# Altium footprint library pre_CONNECTOR.PcbLib: 64 footprints (part 3 of 4)
Each footprint in its own frame and in the unit in brackets; x right, y up, seen from the top. Pads: shape width x height; smd on the part's side, far side on the other; paste and mask are expansions set on the pad; w line width, h text height; cw(c..) or ccw(c..) is an arc to the next point about the centre after c.
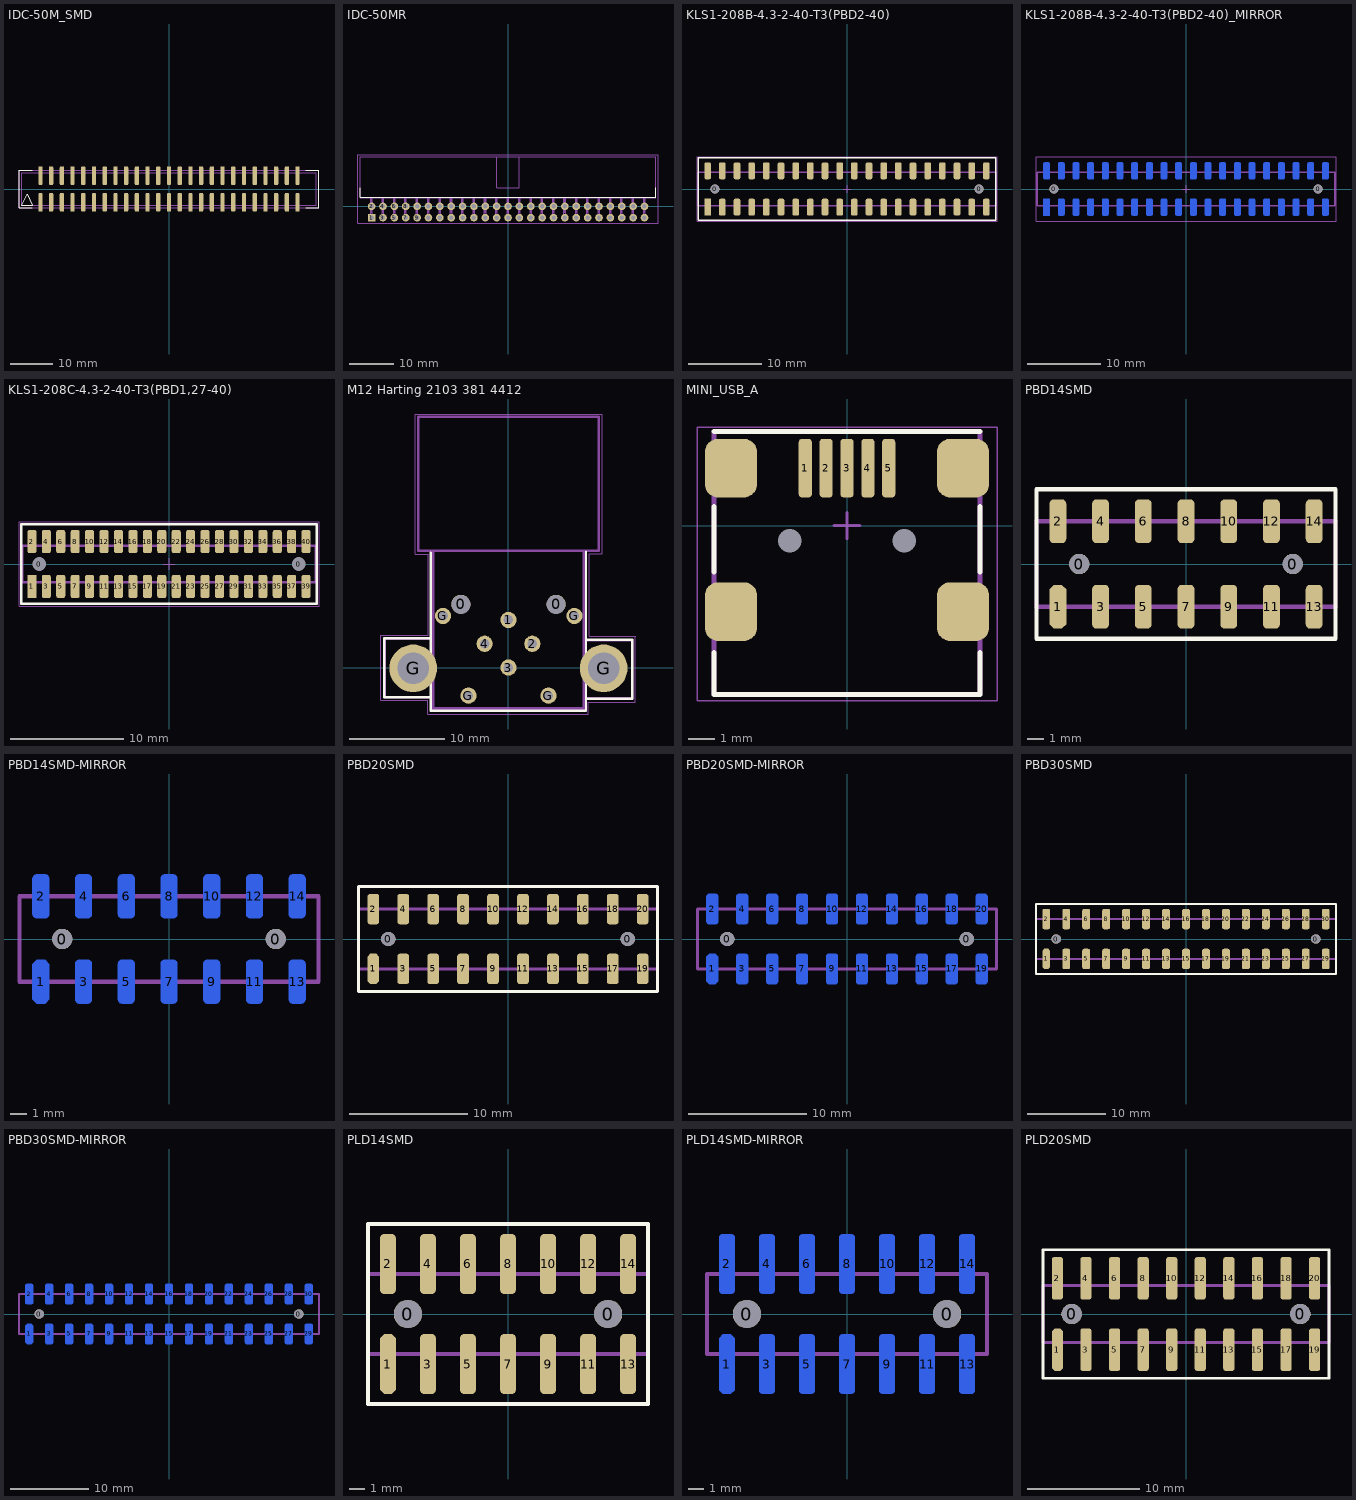
[diagram p2: the footprints below, top view; thin cyan lines are the x and y axes]

## IDC-50M_SMD [mm]
pads (50):
  rrect50% 1x4.4 smd: 1(-30.48,-3.175) 2(-30.48,3.175) 3(-27.94,-3.175) 4(-27.94,3.175) 5(-25.4,-3.175) 6(-25.4,3.175) 7(-22.86,-3.175) 8(-22.86,3.175) 9(-20.32,-3.175) 10(-20.32,3.175) 11(-17.78,-3.175) 12(-17.78,3.175) 13(-15.24,-3.175) 14(-15.24,3.175) 15(-12.7,-3.175) 16(-12.7,3.175) 17(-10.16,-3.175) 18(-10.16,3.175) 19(-7.62,-3.175) 20(-7.62,3.175) 21(-5.08,-3.175) 22(-5.08,3.175) 23(-2.54,-3.175) 24(-2.54,3.175) 25(0,-3.175) 26(0,3.175) 27(2.54,-3.175) 28(2.54,3.175) 29(5.08,-3.175) 30(5.08,3.175) 31(7.62,-3.175) 32(7.62,3.175) 33(10.16,-3.175) 34(10.16,3.175) 35(12.7,-3.175) 36(12.7,3.175) 37(15.24,-3.175) 38(15.24,3.175) 39(17.78,-3.175) 40(17.78,3.175) 41(20.32,-3.175) 42(20.32,3.175) 43(22.86,-3.175) 44(22.86,3.175) 45(25.4,-3.175) 46(25.4,3.175) 47(27.94,-3.175) 48(27.94,3.175) 49(30.48,-3.175) 50(30.48,3.175)
Top Overlay:
  lines w0.254: -32.385,-4.445 -35.56,-4.445 -35.56,4.445 -32.385,4.445 ; 32.385,-4.445 35.56,-4.445 35.56,4.445 32.385,4.445 ; -34.925,-3.81 -32.385,-3.81 -33.655,-1.27 -34.925,-3.81
Top Assy:
  lines w0.254: -2.54,-4.445 -2.54,-3.81 ; 2.54,-4.445 2.54,-3.81 ; -35.56,-4.445 35.56,-4.445 35.56,4.445 -35.56,4.445 -35.56,-4.445 ; -34.925,-3.81 -34.925,3.81 34.925,3.81 34.925,-3.81 -34.925,-3.81
3D body: height 10.2, standoff 1.6, extent -35.56,-4.445 35.56,4.445

## IDC-50MR [mm]
height 8.75
pads (50):
  rect 1.7x1.7 hole 1: 1(-30.48,-2.54)
  round 1.7 hole 1: 2(-30.48,0) 3(-27.94,-2.54) 4(-27.94,0) 5(-25.4,-2.54) 6(-25.4,0) 7(-22.86,-2.54) 8(-22.86,0) 9(-20.32,-2.54) 10(-20.32,0) 11(-17.78,-2.54) 12(-17.78,0) 13(-15.24,-2.54) 14(-15.24,0) 15(-12.7,-2.54) 16(-12.7,0) 17(-10.16,-2.54) 18(-10.16,0) 19(-7.62,-2.54) 20(-7.62,0) 21(-5.08,-2.54) 22(-5.08,0) 23(-2.54,-2.54) 24(-2.54,0) 25(0,-2.54) 26(0,0) 27(2.54,-2.54) 28(2.54,0) 29(5.08,-2.54) 30(5.08,0) 31(7.62,-2.54) 32(7.62,0) 33(10.16,-2.54) 34(10.16,0) 35(12.7,-2.54) 36(12.7,0) 37(15.24,-2.54) 38(15.24,0) 39(17.78,-2.54) 40(17.78,0) 41(20.32,-2.54) 42(20.32,0) 43(22.86,-2.54) 44(22.86,0) 45(25.4,-2.54) 46(25.4,0) 47(27.94,-2.54) 48(27.94,0) 49(30.48,-2.54) 50(30.48,0)
Top Overlay:
  lines w0.254: -33.02,4.1 -33.02,2 -6.35,2 33.02,2 33.02,4.1
Top Assy:
  lines w0.254: -30.485,-1.425 -30.485,2 ; -27.945,-1.425 -27.945,2 ; -25.395,-1.425 -25.395,1.95 ; -22.87,-1.425 -22.87,1.975 ; -20.345,-1.45 -20.345,1.975 ; -17.795,-1.45 -17.795,1.925 ; -15.245,-1.425 -15.245,2 ; -12.695,-1.425 -12.695,1.95 ; -10.17,-1.425 -10.17,1.975 ; -7.645,-1.45 -7.645,1.975 ; -5.095,-1.45 -5.095,1.925 ; -2.57,-1.45 -2.57,1.95 ; 0.005,-1.4 0.005,2.025 ; 2.53,-1.45 2.53,1.975 ; 5.07,-1.425 5.07,1.975 ; 7.595,-1.45 7.595,1.975 ; 10.145,-1.45 10.145,1.925 ; 12.67,-1.45 12.67,1.95 ; 15.245,-1.4 15.245,2.025 ; 17.77,-1.45 17.77,1.975 ; 20.295,-1.45 20.295,1.975 ; 22.845,-1.45 22.845,1.925 ; 25.37,-1.45 25.37,1.95 ; 27.945,-1.4 27.945,2.025 ; 30.47,-1.45 30.47,1.975 ; -33.02,2 -33.02,11.1 -2.5,11.1 -2.5,4.1 2.5,4.1 2.5,11.1 33.02,11.1 33.02,2 -33.02,2
Mechanical 13:
  lines w0.1: -30.66,2.025 -30.66,-2.54 -30.31,-2.54 -30.31,2.025 ; -30.645,2.025 -30.645,-2.54 -30.295,-2.54 -30.295,2.025 ; -28.12,2.025 -28.12,-2.54 -27.77,-2.54 -27.77,2.025 ; -25.57,2.057 -25.57,-2.485 -25.22,-2.475 -25.22,2.057 ; -23.045,-2.508 -23.045,2.057 ; -23.04,-2.54 -22.69,-2.54 ; -22.695,-2.508 -22.695,2.057 ; -20.52,-2.508 -20.52,2.057 ; -20.5,-2.54 -20.15,-2.54 ; -20.17,-2.508 -20.17,2.057 ; -17.96,-2.54 -17.61,-2.54 ; -17.945,2.025 -17.945,-2.54 -17.595,-2.54 ; -17.62,-2.533 -17.62,2.033 ; -15.42,2.025 -15.42,-2.54 -15.07,-2.54 -15.07,2.025 ; -12.87,2.057 -12.87,-2.485 -12.52,-2.475 -12.52,2.057 ; -10.345,-2.508 -10.345,2.057 ; -10.34,-2.54 -9.99,-2.54 ; -9.995,-2.508 -9.995,2.057 ; -7.82,-2.508 -7.82,2.057 ; -7.8,-2.54 -7.45,-2.54 ; -7.47,-2.508 -7.47,2.057 ; -5.27,-2.533 -5.27,2.033 ; -5.26,-2.54 -4.91,-2.54 ; -4.92,-2.533 -4.92,2.033 ; -2.745,-2.533 -2.745,2.033 ; -2.72,-2.54 -2.37,-2.54 ; -2.395,-2.533 -2.395,2.033 ; -0.18,-2.54 0.17,-2.54 ; -0.17,-2.533 -0.17,2.033 ; 0.18,-2.533 0.18,2.033 ; 2.355,2 2.355,-2.565 2.705,-2.565 2.705,2 ; 4.9,-2.54 5.25,-2.54 ; 4.905,2.025 4.905,-2.54 5.255,-2.54 5.255,2.025 ; 7.42,-2.508 7.42,2.057 ; 7.44,-2.54 7.79,-2.54 ; 7.77,-2.508 7.77,2.057 ; 9.97,-2.533 9.97,2.033 ; 9.98,-2.54 10.33,-2.54 ; 10.32,-2.533 10.32,2.033 ; 12.495,-2.533 12.495,2.033 ; 12.52,-2.54 12.87,-2.54 ; 12.845,-2.533 12.845,2.033 ; 15.06,-2.54 15.41,-2.54 ; 15.07,-2.533 15.07,2.033 ; 15.42,-2.533 15.42,2.033 ; 17.595,2 17.595,-2.565 17.945,-2.565 17.945,2 ; 20.12,-2.508 20.12,2.057 ; 20.14,-2.54 20.49,-2.54 ; 20.47,-2.508 20.47,2.057 ; 22.67,-2.533 22.67,2.033 ; 22.68,-2.54 23.03,-2.54 ; 23.02,-2.533 23.02,2.033 ; 25.195,-2.533 25.195,2.033 ; 25.22,-2.54 25.57,-2.54 ; 25.545,-2.533 25.545,2.033 ; 27.76,-2.54 28.11,-2.54 ; 27.77,-2.533 27.77,2.033 ; 28.12,-2.533 28.12,2.033 ; 30.295,2 30.295,-2.565 30.645,-2.565 30.645,2 ; -33.02,1.95 -33.02,11.1 33.02,11.1 33.02,1.95 -33.02,1.95
Mechanical 15:
  lines w0.05: -33.52,-3.775 33.5,-3.775 33.5,11.525 -33.52,11.525 -33.52,-3.775
  lines w0.1: -20.82,0 -19.82,0 ; -20.32,-0.5 -20.32,0.5 ; -8.12,0 -7.12,0 ; -7.62,-0.5 -7.62,0.5 ; 7.12,0 8.12,0 ; 7.62,-0.5 7.62,0.5 ; 19.82,0 20.82,0 ; 20.32,-0.5 20.32,0.5
3D body: height 5.8, standoff 0, extent 7.394,-2.54 7.77,2.075
3D body: height 5.8, standoff 0, extent 9.944,-2.54 10.32,2.075
3D body: height 5.8, standoff 0, extent 12.469,-2.54 12.845,2.075
3D body: height 5.8, standoff 0, extent 15.044,-2.54 15.42,2.075
3D body: height 5.8, standoff 0, extent 17.569,-2.565 17.945,2.05
3D body: height 5.8, standoff 0, extent -30.686,-2.54 -30.31,2.075
3D body: height 5.8, standoff 0, extent -28.146,-2.54 -27.77,2.075
3D body: height 5.8, standoff 0, extent -25.596,-2.54 -25.22,2.075
3D body: height 5.8, standoff 0, extent -23.071,-2.54 -22.695,2.075
3D body: height 5.8, standoff 0, extent -20.546,-2.54 -20.17,2.075
3D body: height 5.8, standoff 0, extent -17.996,-2.54 -17.62,2.075
3D body: height 5.8, standoff 0, extent 4.879,-2.54 5.255,2.075
3D body: height 5.8, standoff 0, extent 2.329,-2.565 2.705,2.05
3D body: height 5.8, standoff 0, extent -0.196,-2.54 0.18,2.075
3D body: height 5.8, standoff 0, extent -2.771,-2.54 -2.395,2.075
3D body: height 5.8, standoff 0, extent -5.296,-2.54 -4.92,2.075
3D body: height 5.8, standoff 0, extent -7.846,-2.54 -7.47,2.075
3D body: height 5.8, standoff 0, extent -10.371,-2.54 -9.995,2.075
3D body: height 5.8, standoff 0, extent -12.896,-2.54 -12.52,2.075
3D body: height 5.8, standoff 0, extent -15.446,-2.54 -15.07,2.075
3D body: height 9, standoff 0, extent -33.022,2.025 33.02,11.125
3D body: height 5.8, standoff 0, extent 30.269,-2.565 30.645,2.05
3D body: height 5.8, standoff 0, extent 27.744,-2.54 28.12,2.075
3D body: height 5.8, standoff 0, extent 25.169,-2.54 25.545,2.075
3D body: height 5.8, standoff 0, extent 22.644,-2.54 23.02,2.075
3D body: height 5.8, standoff 0, extent 20.094,-2.54 20.47,2.075

## KLS1-208B-4.3-2-40-T3(PBD2-40) [mm] "Female Header, Pitch 2.0mm"
height 4.3
pads (42):
  round 1.2 hole 1.2 unplated: 0(-18,0) 0(18,0)
  rect 0.9x2.3 smd: 1(-19,-2.475)
  rrect50% 0.9x2.3 smd: 2(-19,2.475) 3(-17,-2.475) 4(-17,2.475) 5(-15,-2.475) 6(-15,2.475) 7(-13,-2.475) 8(-13,2.475) 9(-11,-2.475) 10(-11,2.475) 11(-9,-2.475) 12(-9,2.475) 13(-7,-2.475) 14(-7,2.475) 15(-5,-2.475) 16(-5,2.475) 17(-3,-2.475) 18(-3,2.475) 19(-1,-2.475) 20(-1,2.475) 21(1,-2.475) 22(1,2.475) 23(3,-2.475) 24(3,2.475) 25(5,-2.475) 26(5,2.475) 27(7,-2.475) 28(7,2.475) 29(9,-2.475) 30(9,2.475) 31(11,-2.475) 32(11,2.475) 33(13,-2.475) 34(13,2.475) 35(15,-2.475) 36(15,2.475) 37(17,-2.475) 38(17,2.475) 39(19,-2.475) 40(19,2.475)
Top Overlay:
  lines w0.2: -20.3,-4.25 20.3,-4.25 20.3,4.25 -20.3,4.25 -20.3,-4.25
Top Assy:
  lines w0.2: -20.3,-2.25 20.3,-2.25 20.3,2.25 -20.3,2.25 -20.3,-2.25
Mechanical 15:
  lines w0.05: -20.45,-4.4 20.45,-4.4 20.45,4.4 -20.45,4.4 -20.45,-4.4
  lines w0.1: -0.5,0 0.5,0 ; 0,-0.5 0,0.5
3D body: height 4.3, standoff 0, extent -20.3,-2.25 20.3,2.25

## KLS1-208B-4.3-2-40-T3(PBD2-40)_MIRROR [mm] "Female Header, Pitch 2.0mm"
height 4.3
pads (42):
  round 1.2 hole 1.2 unplated: 0(-18,0) 0(18,0)
  rect 0.9x2.3 smd far side: 1(-19,-2.475)
  rrect50% 0.9x2.3 smd far side: 2(-19,2.475) 3(-17,-2.475) 4(-17,2.475) 5(-15,-2.475) 6(-15,2.475) 7(-13,-2.475) 8(-13,2.475) 9(-11,-2.475) 10(-11,2.475) 11(-9,-2.475) 12(-9,2.475) 13(-7,-2.475) 14(-7,2.475) 15(-5,-2.475) 16(-5,2.475) 17(-3,-2.475) 18(-3,2.475) 19(-1,-2.475) 20(-1,2.475) 21(1,-2.475) 22(1,2.475) 23(3,-2.475) 24(3,2.475) 25(5,-2.475) 26(5,2.475) 27(7,-2.475) 28(7,2.475) 29(9,-2.475) 30(9,2.475) 31(11,-2.475) 32(11,2.475) 33(13,-2.475) 34(13,2.475) 35(15,-2.475) 36(15,2.475) 37(17,-2.475) 38(17,2.475) 39(19,-2.475) 40(19,2.475)
Bottom Overlay:
  lines w0.2: -20.3,-4.25 20.3,-4.25 20.3,4.25 -20.3,4.25 -20.3,-4.25
Bottom Assy:
  lines w0.2: -20.3,-2.25 20.3,-2.25 20.3,2.25 -20.3,2.25 -20.3,-2.25
Mechanical 15:
  lines w0.05: -20.45,-4.4 20.45,-4.4 20.45,4.4 -20.45,4.4 -20.45,-4.4
  lines w0.1: -0.5,0 0.5,0 ; 0,-0.5 0,0.5
3D body: height 4.3, standoff 0, extent -20.3,-2.25 20.3,2.25

## KLS1-208C-4.3-2-40-T3(PBD1,27-40) [mm] "Female Header, Pitch 1.27mm"
height 4.3
pads (42):
  round 0.8 hole 1.2 unplated: 0(-11.43,0) 0(11.43,0)
  rect 0.8x2.05 smd: 1(-12.065,-1.975)
  rrect50% 0.8x2.05 smd: 2(-12.065,1.975) 3(-10.795,-1.975) 4(-10.795,1.975) 5(-9.525,-1.975) 6(-9.525,1.975) 7(-8.255,-1.975) 8(-8.255,1.975) 9(-6.985,-1.975) 10(-6.985,1.975) 11(-5.715,-1.975) 12(-5.715,1.975) 13(-4.445,-1.975) 14(-4.445,1.975) 15(-3.175,-1.975) 16(-3.175,1.975) 17(-1.905,-1.975) 18(-1.905,1.975) 19(-0.635,-1.975) 20(-0.635,1.975) 21(0.635,-1.975) 22(0.635,1.975) 23(1.905,-1.975) 24(1.905,1.975) 25(3.175,-1.975) 26(3.175,1.975) 27(4.445,-1.975) 28(4.445,1.975) 29(5.715,-1.975) 30(5.715,1.975) 31(6.985,-1.975) 32(6.985,1.975) 33(8.255,-1.975) 34(8.255,1.975) 35(9.525,-1.975) 36(9.525,1.975) 37(10.795,-1.975) 38(10.795,1.975) 39(12.065,-1.975) 40(12.065,1.975)
Top Overlay:
  lines w0.2: -13,-3.5 -13,3.5 13,3.5 13,-3.5 -13,-3.5
Top Assy:
  lines w0.2: -12.9,-1.6 -12.9,1.6 12.9,1.6 12.9,-1.6 -12.9,-1.6
Mechanical 15:
  lines w0.05: -13.2,-3.7 -13.2,3.7 13.2,3.7 13.2,-3.7 -13.2,-3.7
  lines w0.1: -0.5,0 0.5,0 ; 0,-0.5 0,0.5
3D body: height 4.3, standoff 0, extent -12.9,-1.6 12.9,1.6

## M12 Harting 2103 381 4412 [mm]
pads (12):
  round 2 hole 2 unplated: 0(-5,6.642) 0(5,6.642)
  round 1.7 hole 1: 1(0,5) 2(2.5,2.5) 3(0,0) 4(-2.5,2.5) G(-6.875,5.422) G(-4.2,-2.95) G(4.2,-2.95) G(6.925,5.422)
  round 5 / inner round 3.3 / far side round 8 hole 3.3 unplated: G(-10,-0.075) G(10,-0.075)
Top Overlay:
  lines w0.254: -8.235,3.058 -13.05,3.058 -13.05,-3.125 -8.23,-3.125 ; -8.159,12.075 -8.159,-4.535 8.136,-4.535 8.136,12.15 ; 8.213,2.925 13,2.925 13,-3.289 8.244,-3.289
Top Assy:
  lines w0.254: -13,-3.1 -7.9,-3.1 -7.9,3 -13,3 -13,-3.1 ; -9.5,12.25 -9.5,26.32 9.5,26.32 9.5,12.25 -0.44,12.25 -9.5,12.25 ; -7.9,-4.4 7.9,-4.4 7.9,12.25 -7.9,12.25 -7.9,-4.4 ; 7.896,-3.243 13,-3.243 13,2.857 7.896,2.857 7.896,-3.243
Mechanical 13:
  lines w0.254: -13.006,-3.102 -7.902,-3.102 -7.902,3.001 -13.006,3.001 -13.006,-3.102 ; -9.486,12.25 -9.486,26.315 9.492,26.315 9.492,12.25 -9.486,12.25 ; -7.902,-4.281 -7.902,12.25 7.911,12.25 7.911,-4.281 -7.902,-4.281 ; 7.902,-3.241 7.902,2.858 12.998,2.858 12.998,-3.241 7.902,-3.241
Mechanical 15:
  lines w0.05: -13.425,-3.45 -13.425,3.375 -8.45,3.375 -8.425,3.4 -8.425,11.85 -8.45,11.875 -9.775,11.875 -9.775,26.625 9.85,26.625 9.85,11.925 8.5,11.925 8.5,3.275 13.3,3.275 13.325,3.25 13.325,-3.625 13.3,-3.625 8.4,-3.625 8.4,-4.875 -8.5,-4.875 -8.5,-3.45 -13.425,-3.45
3D body: height 13.8, standoff 0, extent -7.924,-4.281 7.91,12.25
3D body: height 5.9, standoff 0, extent 7.885,-3.161 13.003,2.809
3D body: height 5.9, standoff 0, extent -12.85,-2.94 -7.907,2.86
3D body: height 14.9, standoff 0, extent -9.497,12.227 9.504,26.335

## MINI_USB_A [mm]
pads (11):
  rrect50% 0.5x2.25 smd: 1(-1.6,2.204) 2(-0.8,2.204) 3(0,2.204) 4(0.8,2.204) 5(1.6,2.204)
  rrect50% 2x2.25 smd: ""(-4.45,-3.296) ""(-4.45,2.204) ""(4.45,-3.296) ""(4.45,2.204)
  round 0.8 hole 0.9: ""(-2.2,-0.575) ""(2.2,-0.575)
Top Overlay:
  lines w0.2: -5.1,-4.871 -5.1,-6.471 5.1,-6.471 5.1,-4.871 ; -5.1,-1.771 -5.1,0.729 ; -5.1,3.604 5.1,3.604 ; 5.1,-1.771 5.1,0.729
Top Assy:
  lines w0.2: -5.1,-6.471 5.1,-6.471 5.1,3.604 -5.1,3.604 -5.1,-6.471
Mechanical 13:
  lines w0.1: -5.1,-6.471 -5.1,-1.971 -5.1,0.829 -5.1,3.554 -4.825,3.554 5.1,3.554 5.1,-6.471 -5.1,-6.471
Mechanical 15:
  lines w0.05: -5.75,-6.721 -5.75,3.779 5.75,3.779 5.75,-6.721 -5.75,-6.721
  lines w0.1: -0.5,0.004 0.5,0.004 ; 0,-0.496 0,0.504
3D body "USB2066-05-RBHM-15-STB-00-00-A_revD.STEP": height 3.92, standoff -0.03, extent -4.95,-6.194 4.95,3.202

## PBD14SMD [mm]
height 7.4
pads (16):
  round 1.2 hole 1.2 unplated: 0(-6.35,0) 0(6.35,0)
  oct 1x2.6 smd: 1(-7.62,-2.54)
  rrect50% 1x2.6 smd: 2(-7.62,2.54) 3(-5.08,-2.54) 4(-5.08,2.54) 5(-2.54,-2.54) 6(-2.54,2.54) 7(0,-2.54) 8(0,2.54) 9(2.54,-2.54) 10(2.54,2.54) 11(5.08,-2.54) 12(5.08,2.54) 13(7.62,-2.54) 14(7.62,2.54)
Top Overlay:
  lines w0.254: -8.89,-4.445 -8.89,4.445 8.89,4.445 8.89,-4.445 -8.89,-4.445
Top Assy:
  lines w0.254: -8.89,-2.54 -8.89,2.54 8.89,2.54 8.89,-2.54 -8.89,-2.54
3D body: height 7.4, standoff 0, extent -8.89,-2.54 8.89,2.54

## PBD14SMD-MIRROR [mm]
height 7.4
pads (16):
  round 1.2 hole 1.2 unplated: 0(-6.35,0) 0(6.35,0)
  oct 1x2.6 smd far side: 1(-7.62,-2.54)
  rrect50% 1x2.6 smd far side: 2(-7.62,2.54) 3(-5.08,-2.54) 4(-5.08,2.54) 5(-2.54,-2.54) 6(-2.54,2.54) 7(0,-2.54) 8(0,2.54) 9(2.54,-2.54) 10(2.54,2.54) 11(5.08,-2.54) 12(5.08,2.54) 13(7.62,-2.54) 14(7.62,2.54)
Bottom Overlay:
  lines w0.254: -8.89,-4.445 -8.89,4.445 8.89,4.445 8.89,-4.445 -8.89,-4.445
Bottom Assy:
  lines w0.254: -8.89,-2.54 -8.89,2.54 8.89,2.54 8.89,-2.54 -8.89,-2.54
3D body: height 7.4, standoff 0, extent -8.89,-2.54 8.89,2.54

## PBD20SMD [mm]
height 7.4
pads (22):
  round 1.2 hole 1.2 unplated: 0(-10.16,0) 0(10.16,0)
  oct 1x2.6 smd: 1(-11.43,-2.54)
  rrect50% 1x2.6 smd: 2(-11.43,2.54) 3(-8.89,-2.54) 4(-8.89,2.54) 5(-6.35,-2.54) 6(-6.35,2.54) 7(-3.81,-2.54) 8(-3.81,2.54) 9(-1.27,-2.54) 10(-1.27,2.54) 11(1.27,-2.54) 12(1.27,2.54) 13(3.81,-2.54) 14(3.81,2.54) 15(6.35,-2.54) 16(6.35,2.54) 17(8.89,-2.54) 18(8.89,2.54) 19(11.43,-2.54) 20(11.43,2.54)
Top Overlay:
  lines w0.254: -12.7,-4.445 12.7,-4.445 12.7,4.445 -12.7,4.445 -12.7,-4.445
Top Assy:
  lines w0.254: -12.7,-2.54 12.7,-2.54 12.7,2.54 -12.7,2.54 -12.7,-2.54
3D body: height 7.4, standoff 0, extent -12.7,-2.54 12.7,2.54

## PBD20SMD-MIRROR [mm]
height 7.4
pads (22):
  round 1.2 hole 1.2 unplated: 0(-10.16,0) 0(10.16,0)
  oct 1x2.6 smd far side: 1(-11.43,-2.54)
  rrect50% 1x2.6 smd far side: 2(-11.43,2.54) 3(-8.89,-2.54) 4(-8.89,2.54) 5(-6.35,-2.54) 6(-6.35,2.54) 7(-3.81,-2.54) 8(-3.81,2.54) 9(-1.27,-2.54) 10(-1.27,2.54) 11(1.27,-2.54) 12(1.27,2.54) 13(3.81,-2.54) 14(3.81,2.54) 15(6.35,-2.54) 16(6.35,2.54) 17(8.89,-2.54) 18(8.89,2.54) 19(11.43,-2.54) 20(11.43,2.54)
Bottom Overlay:
  lines w0.254: -12.7,-4.445 -12.7,4.445 12.7,4.445 12.7,-4.445 -12.7,-4.445
Bottom Assy:
  lines w0.254: -12.7,-2.54 -12.7,2.54 12.7,2.54 12.7,-2.54 -12.7,-2.54
3D body: height 7.4, standoff 0, extent -12.7,-2.54 12.7,2.54

## PBD30SMD [mm]
height 7.4
pads (32):
  round 1.2 hole 1.2 unplated: 0(-16.51,0) 0(16.51,0)
  oct 1x2.6 smd: 1(-17.78,-2.54)
  rrect50% 1x2.6 smd: 2(-17.78,2.54) 3(-15.24,-2.54) 4(-15.24,2.54) 5(-12.7,-2.54) 6(-12.7,2.54) 7(-10.16,-2.54) 8(-10.16,2.54) 9(-7.62,-2.54) 10(-7.62,2.54) 11(-5.08,-2.54) 12(-5.08,2.54) 13(-2.54,-2.54) 14(-2.54,2.54) 15(0,-2.54) 16(0,2.54) 17(2.54,-2.54) 18(2.54,2.54) 19(5.08,-2.54) 20(5.08,2.54) 21(7.62,-2.54) 22(7.62,2.54) 23(10.16,-2.54) 24(10.16,2.54) 25(12.7,-2.54) 26(12.7,2.54) 27(15.24,-2.54) 28(15.24,2.54) 29(17.78,-2.54) 30(17.78,2.54)
Top Overlay:
  lines w0.254: -19.05,-4.445 -19.05,4.445 19.05,4.445 19.05,-4.445 -19.05,-4.445
Top Assy:
  lines w0.254: -19.05,-2.54 -19.05,2.54 19.05,2.54 19.05,-2.54 -19.05,-2.54
3D body: height 7.4, standoff 0, extent -19.05,-2.54 19.05,2.54

## PBD30SMD-MIRROR [mm]
height 7.4
pads (32):
  round 1.2 hole 1.2 unplated: 0(-16.51,0) 0(16.51,0)
  oct 1x2.6 smd far side: 1(-17.78,-2.54)
  rrect50% 1x2.6 smd far side: 2(-17.78,2.54) 3(-15.24,-2.54) 4(-15.24,2.54) 5(-12.7,-2.54) 6(-12.7,2.54) 7(-10.16,-2.54) 8(-10.16,2.54) 9(-7.62,-2.54) 10(-7.62,2.54) 11(-5.08,-2.54) 12(-5.08,2.54) 13(-2.54,-2.54) 14(-2.54,2.54) 15(0,-2.54) 16(0,2.54) 17(2.54,-2.54) 18(2.54,2.54) 19(5.08,-2.54) 20(5.08,2.54) 21(7.62,-2.54) 22(7.62,2.54) 23(10.16,-2.54) 24(10.16,2.54) 25(12.7,-2.54) 26(12.7,2.54) 27(15.24,-2.54) 28(15.24,2.54) 29(17.78,-2.54) 30(17.78,2.54)
Bottom Overlay:
  lines w0.254: -19.05,-4.445 19.05,-4.445 19.05,4.445 -19.05,4.445 -19.05,-4.445
Bottom Assy:
  lines w0.254: -19.05,-2.54 19.05,-2.54 19.05,2.54 -19.05,2.54 -19.05,-2.54
3D body: height 7.4, standoff 0, extent -19.05,-2.54 19.05,2.54

## PLD14SMD [mm]
height 3.8
pads (16):
  round 1.8 hole 1.8 unplated: 0(-6.35,0) 0(6.35,0)
  oct 1x3.8 smd: 1(-7.62,-3.175)
  rrect50% 1x3.8 smd: 2(-7.62,3.175) 3(-5.08,-3.175) 4(-5.08,3.175) 5(-2.54,-3.175) 6(-2.54,3.175) 7(0,-3.175) 8(0,3.175) 9(2.54,-3.175) 10(2.54,3.175) 11(5.08,-3.175) 12(5.08,3.175) 13(7.62,-3.175) 14(7.62,3.175)
Top Overlay:
  lines w0.254: -8.89,-5.715 -8.89,5.715 8.89,5.715 8.89,-5.715 -8.89,-5.715
Top Assy:
  lines w0.254: -8.89,-2.54 8.89,-2.54 8.89,2.54 -8.89,2.54 -8.89,-2.54
3D body: height 7.4, standoff 0, extent -8.89,-2.54 8.89,2.54

## PLD14SMD-MIRROR [mm]
height 3.8
pads (16):
  round 1.8 hole 1.8 unplated: 0(-6.35,0) 0(6.35,0)
  oct 1x3.8 smd far side: 1(-7.62,-3.175)
  rrect50% 1x3.8 smd far side: 2(-7.62,3.175) 3(-5.08,-3.175) 4(-5.08,3.175) 5(-2.54,-3.175) 6(-2.54,3.175) 7(0,-3.175) 8(0,3.175) 9(2.54,-3.175) 10(2.54,3.175) 11(5.08,-3.175) 12(5.08,3.175) 13(7.62,-3.175) 14(7.62,3.175)
Bottom Overlay:
  lines w0.254: -8.89,-5.715 8.89,-5.715 8.89,5.715 -8.89,5.715 -8.89,-5.715
Bottom Assy:
  lines w0.254: -8.89,-2.54 8.89,-2.54 8.89,2.54 -8.89,2.54 -8.89,-2.54
3D body: height 3.8, standoff 0, extent -8.89,-2.54 8.89,2.54

## PLD20SMD [mm]
height 3.8
pads (22):
  round 1.8 hole 1.8 unplated: 0(-10.16,0) 0(10.16,0)
  oct 1x3.8 smd: 1(-11.43,-3.175)
  rrect50% 1x3.8 smd: 2(-11.43,3.175) 3(-8.89,-3.175) 4(-8.89,3.175) 5(-6.35,-3.175) 6(-6.35,3.175) 7(-3.81,-3.175) 8(-3.81,3.175) 9(-1.27,-3.175) 10(-1.27,3.175) 11(1.27,-3.175) 12(1.27,3.175) 13(3.81,-3.175) 14(3.81,3.175) 15(6.35,-3.175) 16(6.35,3.175) 17(8.89,-3.175) 18(8.89,3.175) 19(11.43,-3.175) 20(11.43,3.175)
Top Overlay:
  lines w0.254: -12.7,-5.715 -12.7,5.715 12.7,5.715 12.7,-5.715 -12.7,-5.715
Top Assy:
  lines w0.254: -12.7,-2.54 12.7,-2.54 12.7,2.54 -12.7,2.54 -12.7,-2.54
3D body: height 3.8, standoff 0, extent -12.7,-2.54 12.7,2.54